# Altium footprint library cool_library.PcbLib: 1182 footprints (part 40 of 75)
Each footprint in its own frame and in the unit in brackets; x right, y up, seen from the top. Pads: shape width x height; smd on the part's side, far side on the other; paste and mask are expansions set on the pad; w line width, h text height; cw(c..) or ccw(c..) is an arc to the next point about the centre after c.
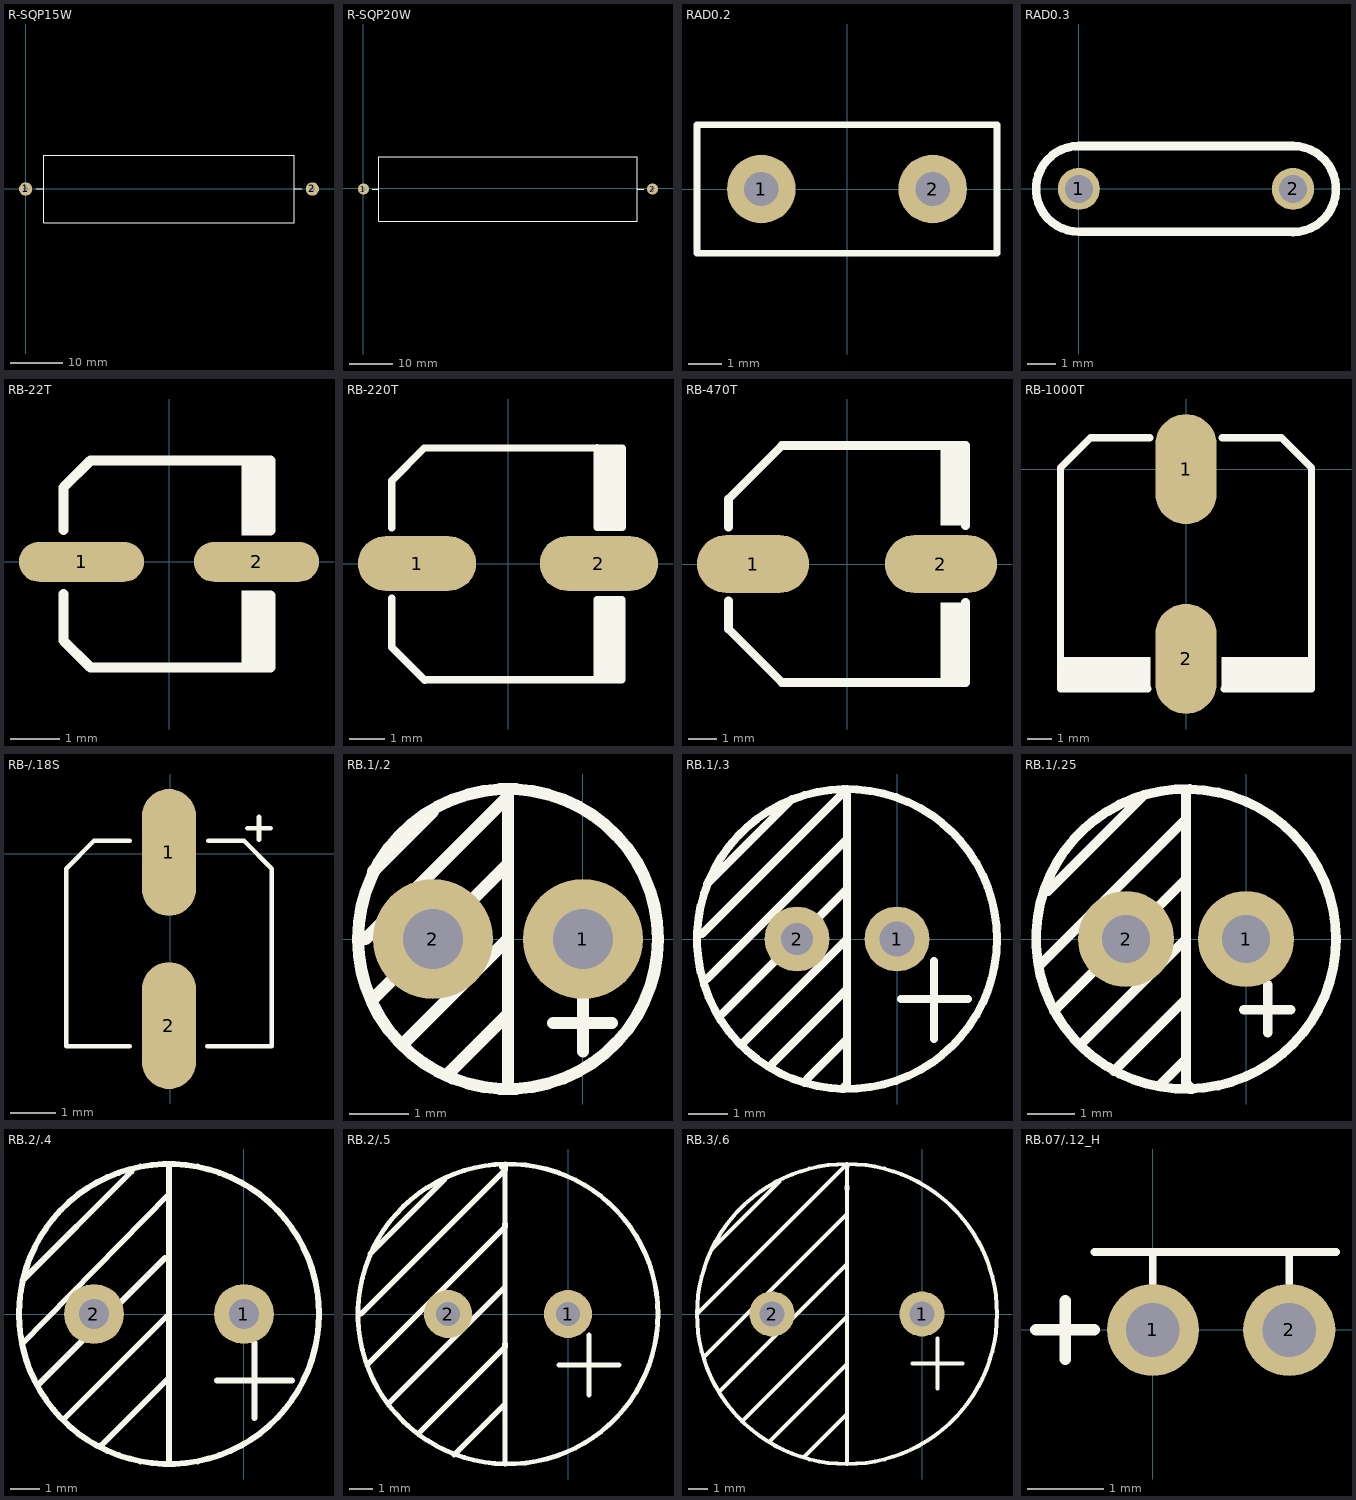
[diagram p39: the footprints below, top view; thin cyan lines are the x and y axes]

## R-SQP15W [mil]
pads (2):
  round 100 hole 40: 1(-0.18,-2.5) 2(2165.18,-2.5)
Top Overlay:
  lines w8: 78.56,-2.5 137.62,-2.5 ; 2027.38,-2.5 2086.44,-2.5 ; 137.62,-258.41 2027.38,-258.41 2027.38,253.41 137.62,253.41 137.62,-258.41

## R-SQP20W [mil]
pads (2):
  round 100 hole 40: 1(3.6,-5) 2(2641.4,-5)
Top Overlay:
  lines w8: 82.34,-5 141.4,-5 ; 2503.6,-5 2562.66,-5 ; 141.4,-300.28 141.4,290.28 2503.6,290.28 2503.6,-300.28 141.4,-300.28

## RAD0.2 [mil]
pads (2):
  round 80 hole 40: 1(-100,0) 2(100,0)
Top Overlay:
  lines w8: -175,-75 175,-75 175,75 -175,75 -175,-75

## RAD0.3 [mm]
pads (2):
  round 1.5 hole 1: 1(0,0) 2(7.62,0)
Top Overlay:
  lines w0.305: 7.62,-1.536 ccw(c7.62,-0.006) 7.62,1.524 0,1.524 ccw(c0,0) 0,-1.524 7.62,-1.524

## RB-22T [mil]
pads (2):
  oval 100x32 smd: 1(-70,0) 2(70,0)
Top Overlay:
  region: 81,-23 58,-23 58,-84.35 81,-84.35
  region: 81,81 58,81 58,21 81,21
  lines w8: -84.35,-25.65 -84.35,-63 -63,-84.35 81,-84.35 81,-27 ; -84.35,25.65 -84.35,59.65 -63,81 81,81 81,25

## RB-220T [mil]
pads (2):
  oval 130x60 smd: 1(-100,0) 2(100,0)
Top Overlay:
  region: 125.58,127.41 98,127.41 98,36 125.58,36
  region: 125.58,-36 98,-36 98,-128.5 125.58,-128.5
  lines w8: -128,-38 -128,-92 -91.51,-128.41 ; -128,39 -128,91 -92,127 126,127 126,40 ; -91,-128 125,-128 125,-40 ; 98,-128 98,-40 ; 98,40 98,127.41

## RB-470T [mil]
pads (2):
  oval 155x80 smd: 1(-130,0) 2(130,0)
Top Overlay:
  region: 129,164 129,53 164,53 164,164
  region: 164,-164 164,-53 129,-53 129,-164
  lines w12: -164,-51 -164,-90 -90,-164 164,-164 164,-53 ; -164,51 -164,90 -90,164 164,164 164,53

## RB-1000T [mil]
height 450
pads (2):
  oval 100x180 smd: 1(0,0) 2(0,-310)
Top Overlay:
  region: 202.75,-307.17 58,-307.17 58,-358.11 202.75,-358.11
  rectangle: -202.75,-358.11 -58,-307.17
  lines w12: -62,-359 -205,-359 -205,2 -156,51 -59,51 ; 59,51 156,51 205,2 205,-359 62,-359

## RB-/.18S [mil]
height 150
pads (2):
  oval 47x110 smd: 1(-1,1) 2(-1,-149)
Top Overlay:
  lines w4: -35,-167 -90,-167 -90,-13 -66,11 -35,11 ; 32,-167 88,-167 88,-13 64,11 33,11 ; 67,22 87,22 ; 77,12 77,32

## RB.1/.2 [mil]
pads (2):
  round 80 hole 40: 1(0,0) 2(-100,0)
Top Overlay:
  circle w8: c-50,0 r100
  lines w8: -145,0 -50,95 -50,-95 ; -140,-40 -50,50 ; -140,45 -100,85 ; -120,-70 -50,0 ; -90,-90 -50,-50 ; -20,-56 19.37,-56 ; 0,-75 0,-35

## RB.1/.3 [mil]
pads (2):
  round 65 hole 35: 1(0,0)
  round 65 hole 32: 2(-100,0)
Top Overlay:
  circle w8: c-50,0 r150
  lines w8: -195,5 -50,150 -50,-145 -55,-150 ; -190,-40 -50,100 ; -190,55 -105,140 ; -175,-75 -50,50 ; -155,-105 -50,0 ; -125,-125 -50,-50 ; -90,-140 -50,-100 ; 4,-60 71,-60 ; 37,-100 37,-22

## RB.1/.25 [mil]
pads (2):
  round 80 hole 40: 1(0,0) 2(-100,0)
Top Overlay:
  circle w8: c-50,0 r125
  lines w8: -170,-20 -50,100 ; -165,40 -85,120 ; -160,-60 -50,50 ; -135,-85 -50,0 ; -110,-110 -50,-50 ; -70,-120 -50,-100 -50,-105 ; -50,120 -50,-120 -45,-125 ; -2,-59 37.37,-59 ; 18,-78 18,-38

## RB.2/.4 [mil]
pads (2):
  round 80 hole 40: 1(0,0) 2(-200,0)
Top Overlay:
  circle w8: c-100,0 r200
  lines w8: -296,-40 -100,160 ; -295,45 -150,190 ; -275,-95 -105,75 -100,75 ; -240,-140 -100,0 ; -190,-175 -100,-85 ; -100,-200 -100,200 ; -36,-89 64,-89 ; 14,-139 14,-39

## RB.2/.5 [mil]
pads (2):
  round 80 hole 40: 1(0,0) 2(-200,0)
Top Overlay:
  circle w8: c-100,0 r250
  lines w8: -345,0 -105,240 ; -335,-85 -105,145 ; -330,100 -205,225 ; -300,-150 -105,45 ; -250,-200 -105,-55 ; -190,-235 -105,-150 ; -105,-250 -105,245 ; -15,-85 85,-85 ; 35,-135 35,-35
  lines w10: -110,245 -105,245 -105,240 ; -105,-55 -105,-50 ; -105,145 -105,150

## RB.3/.6 [mil]
pads (2):
  round 90 hole 50: 1(0,0) 2(-300,0)
Top Overlay:
  circle w8: c-150,0 r300
  lines w8: -450,0 -155,295 ; -435,-85 -150,200 ; -420,130 -285,265 ; -405,-155 -150,100 ; -360,-215 -150,-5 ; -305,-255 -150,-100 ; -235,-285 -150,-200 ; -150,-300 -150,295 ; -19,-99 81,-99 ; 31,-149 31,-49
  lines w10: -155,295 -150,295 ; -150,250 -150,255

## RB.07/.12_H [mm]
pads (2):
  round 1.2 hole 0.7: 1(0,0) 2(1.778,0)
Top Overlay:
  lines w0.1: -0.762,1.016 2.388,1.016 ; 0,0.61 0,0.991 ; 1.778,0.61 1.778,0.991
  lines w0.15: -1.524,0 -0.762,0 ; -1.143,-0.381 -1.143,0.381